# Altium footprint library Indruino.PcbLib: 383 footprints (part 21 of 24)
Each footprint in its own frame and in the unit in brackets; x right, y up, seen from the top. Pads: shape width x height; smd on the part's side, far side on the other; paste and mask are expansions set on the pad; w line width, h text height; cw(c..) or ccw(c..) is an arc to the next point about the centre after c.
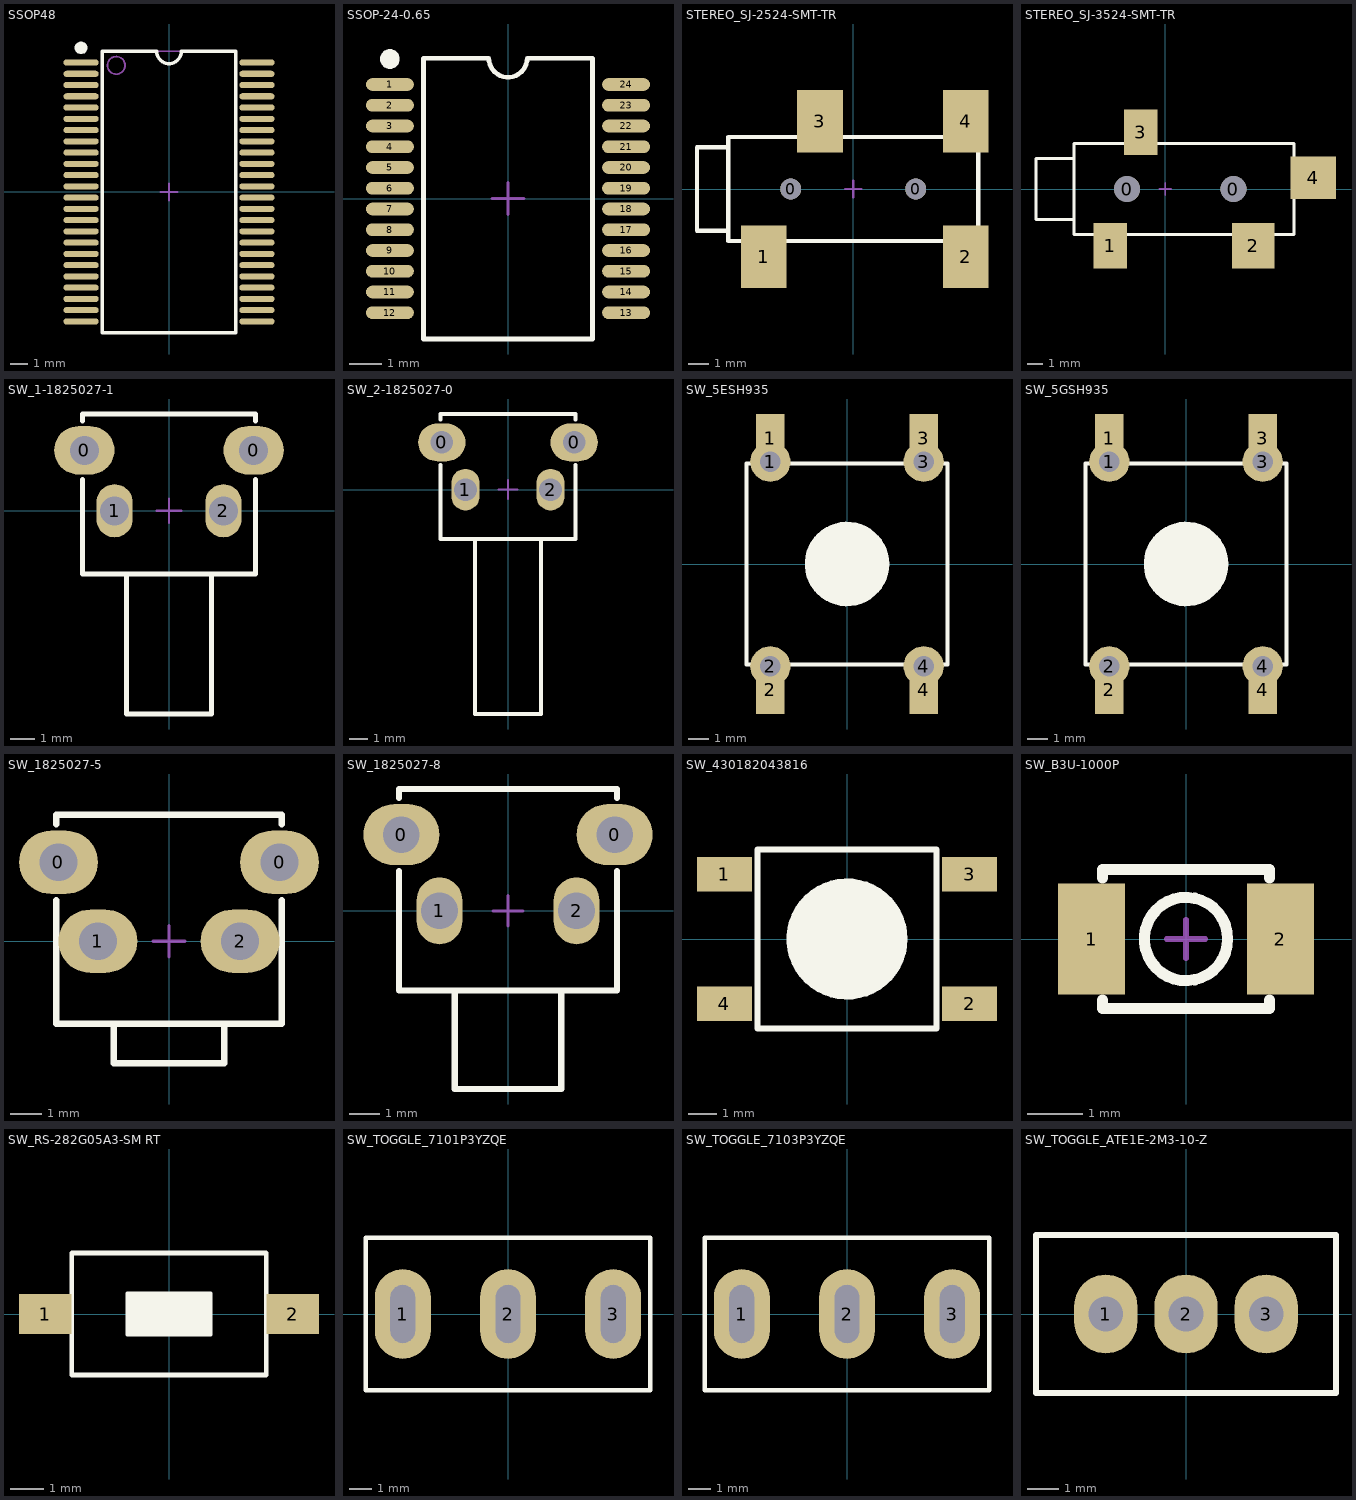
[diagram p20: the footprints below, top view; thin cyan lines are the x and y axes]

## SSOP48 [mm]
pads (48):
  oval 2x0.35 smd: 1(-5,7.36) 2(-5,6.72) 3(-5,6.08) 4(-5,5.44) 5(-5,4.8) 6(-5,4.16) 7(-5,3.52) 8(-5,2.88) 9(-5,2.24) 10(-5,1.6) 11(-5,0.96) 12(-5,0.32) 13(-5,-0.32) 14(-5,-0.96) 15(-5,-1.6) 16(-5,-2.24) 17(-5,-2.88) 18(-5,-3.52) 19(-5,-4.16) 20(-5,-4.8) 21(-5,-5.44) 22(-5,-6.08) 23(-5,-6.72) 24(-5,-7.36) 25(5,-7.36) 26(5,-6.72) 27(5,-6.08) 28(5,-5.44) 29(5,-4.8) 30(5,-4.16) 31(5,-3.52) 32(5,-2.88) 33(5,-2.24) 34(5,-1.6) 35(5,-0.96) 36(5,-0.32) 37(5,0.32) 38(5,0.96) 39(5,1.6) 40(5,2.24) 41(5,2.88) 42(5,3.52) 43(5,4.16) 44(5,4.8) 45(5,5.44) 46(5,6.08) 47(5,6.72) 48(5,7.36)
Top Overlay:
  region: -5,7.85 -5.07,7.85 -5.198,7.903 -5.297,8.002 -5.35,8.13 -5.35,8.2 -5.35,8.27 -5.297,8.398 -5.198,8.497 -5.07,8.55 -5,8.55 -4.93,8.55 -4.802,8.497 -4.703,8.398 -4.65,8.27 -4.65,8.2 -4.65,8.13 -4.703,8.002 -4.802,7.903 -4.93,7.85
  lines w0.2: -3.8,-8 -3.8,8 -0.7,8 ccw(c0,8) 0.7,8 3.8,8 3.8,-8 -3.8,-8
Mechanical 13:
  circle w0.1: c-3,7.2 r0.5
  lines w0.1: -3.8,-8 -3.8,8 3.8,8 3.8,-8 -3.8,-8
Mechanical 15:
  lines w0.1: -0.5,0 0.5,0 ; 0,-0.5 0,0.5
3D body "User Library-SSOP48.step": height 2.57, standoff -0.08, extent -5.2,-8 5.2,8

## SSOP-24-0.65 [mm] "TSSOP, 24-Leads, Body 8.3x5.3mm, Pitch 0.65mm, IPC Low Density"
height 1.5
pads (24):
  oval 1.5x0.4 smd: 1(-3.7,3.575) 2(-3.7,2.925) 3(-3.7,2.275) 4(-3.7,1.625) 5(-3.7,0.975) 6(-3.7,0.325) 7(-3.7,-0.325) 8(-3.7,-0.975) 9(-3.7,-1.625) 10(-3.7,-2.275) 11(-3.7,-2.925) 12(-3.7,-3.575) 13(3.7,-3.575) 14(3.7,-2.925) 15(3.7,-2.275) 16(3.7,-1.625) 17(3.7,-0.975) 18(3.7,-0.325) 19(3.7,0.325) 20(3.7,0.975) 21(3.7,1.625) 22(3.7,2.275) 23(3.7,2.925) 24(3.7,3.575)
Top Overlay:
  region: -3.7,4.075 -3.76,4.075 -3.87,4.121 -3.954,4.205 -4,4.315 -4,4.375 -4,4.435 -3.954,4.545 -3.87,4.629 -3.76,4.675 -3.7,4.675 -3.64,4.675 -3.53,4.629 -3.446,4.545 -3.4,4.435 -3.4,4.375 -3.4,4.315 -3.446,4.205 -3.53,4.121 -3.64,4.075
  lines w0.15: -2.65,-4.4 -2.65,4.4 -0.6,4.4 ccw(c0,4.4) 0.6,4.4 2.65,4.4 2.65,-4.4 -2.65,-4.4
Mechanical 15:
  lines w0.1: -0.5,0 0.5,0 ; 0,-0.5 0,0.5
3D body "User Library-SSOP 24 PIN_.step": height 1.98, standoff -0.01, extent -3.95,-4.315 3.95,4.315

## STEREO_SJ-2524-SMT-TR [mm]
pads (6):
  round 1 hole 1: 0(-3,0) 0(3,0)
  rect 2.2x3 smd: 1(-4.3,-3.25) 2(5.4,-3.25) 3(-1.6,3.25) 4(5.4,3.25)
Top Overlay:
  lines w0.2: -6,-2 -7.5,-2 -7.5,2 -6,2 ; -6,-2.5 6,-2.5 6,2.5 -6,2.5 -6,-2.5
Mechanical 13:
  lines w0.1: -6,-2 -7.5,-2 -7.5,2 -6,2 ; -6,-2.5 -6,2.5 6,2.5 6,-2.5 -6,-2.5
Mechanical 15:
  lines w0.1: -0.4,0 0.4,0 ; 0,-0.4 0,0.4
3D body "sj-2524-smt.stp": height 4.6, standoff -0.7, extent -7.5,-4 6,4

## STEREO_SJ-3524-SMT-TR [mm]
pads (6):
  round 1.7 hole 1.7: 0(-2.5,0) 0(4.5,0)
  rect 2.2x3 smd: 1(-3.6,-3.75) 3(-1.6,3.75)
  rect 2.8x3 smd: 2(5.8,-3.75)
  rect 3x2.8 smd: 4(9.75,0.75)
Top Overlay:
  lines w0.2: -6,-2 -8.5,-2 -8.5,2 -6,2 ; -6,-3 -6,3 8.5,3 8.5,-3 -6,-3
Mechanical 13:
  lines w0.1: -6,-2 -8.5,-2 -8.5,2 -6,2 ; -6,-3 8.5,-3 8.5,3 -6,3 -6,-3
Mechanical 15:
  lines w0.1: -0.4,0 0.4,0 ; 0,-0.4 0,0.4
3D body "sj-3524-smt.stp": height 5.1, standoff -0.7, extent -8.5,-4.5 10.5,4.5

## SW_1-1825027-1 [mm]
pads (4):
  oval 2.5x2 hole 1.2: 0(-3.5,2.5) 0(3.5,2.5)
  oval 1.5x2.2 hole 1.2: 1(-2.25,0) 2(2.25,0)
Top Overlay:
  lines w0.2: -3.575,1.3 -3.575,-2.61 3.575,-2.61 3.575,1.3 ; -3.575,3.7 -3.575,4 3.575,4 3.575,3.7 ; -1.75,-2.61 -1.75,-8.4 1.75,-8.4 1.75,-2.61
Mechanical 15:
  lines w0.1: -0.5,0 0.5,0 ; 0,-0.5 0,0.5
3D body "c-1-1825027-1-g-3d.stp": height 7, standoff -3.52, extent -4.204,-8.34 4.204,4.017

## SW_2-1825027-0 [mm]
pads (4):
  oval 2.5x2 hole 1.2: 0(-3.5,2.5) 0(3.5,2.5)
  oval 1.5x2.2 hole 1.2: 1(-2.25,0) 2(2.25,0)
Top Overlay:
  lines w0.2: -3.575,1.3 -3.575,-2.61 3.575,-2.61 3.575,1.3 ; -3.575,3.7 -3.575,4 3.575,4 3.575,3.7 ; -1.75,-2.61 -1.75,-11.871 1.75,-11.871 1.75,-2.61
Mechanical 15:
  lines w0.1: -0.5,0 0.5,0 ; 0,-0.5 0,0.5
3D body "c-2-1825027-0-g-3d.stp": height 7, standoff -3.52, extent -4.204,-11.871 4.204,3.992

## SW_5ESH935 [mm]
pads (8):
  rect 1.4x2.4 smd: 1(-3.81,6.25) 2(-3.81,-6.25) 3(3.81,6.25) 4(3.81,-6.25)
  round 2 hole 1: 1(-3.81,5.08) 2(-3.81,-5.08) 3(3.81,5.08) 4(3.81,-5.08)
Top Overlay:
  circle w0.2: c0,0 r2
  region: 2,0 2,-0.197 1.923,-0.583 1.772,-0.947 1.554,-1.275 1.275,-1.554 0.947,-1.772 0.583,-1.923 0.197,-2 0,-2 -0.197,-2 -0.583,-1.923 -0.947,-1.772 -1.275,-1.554 -1.554,-1.275 -1.772,-0.947 -1.923,-0.583 -2,-0.197 -2,0 -2,0.197 -1.923,0.583 -1.772,0.947 -1.554,1.275 -1.275,1.554 -0.947,1.772 -0.583,1.923 -0.197,2 0,2 0.197,2 0.583,1.923 0.947,1.772 1.275,1.554 1.554,1.275 1.772,0.947 1.923,0.583 2,0.197
  lines w0.2: -5,-5 5,-5 5,5 -5,5 -5,-5
3D body "5ESH9.stp": height 6.37, standoff 0, extent -5,-7 5,7

## SW_5GSH935 [mm]
pads (8):
  rect 1.4x2.4 smd: 1(-3.81,6.25) 2(-3.81,-6.25) 3(3.81,6.25) 4(3.81,-6.25)
  round 2 hole 1: 1(-3.81,5.08) 2(-3.81,-5.08) 3(3.81,5.08) 4(3.81,-5.08)
Top Overlay:
  circle w0.2: c0,0 r2
  region: 2,0 2,-0.197 1.923,-0.583 1.772,-0.947 1.554,-1.275 1.275,-1.554 0.947,-1.772 0.583,-1.923 0.197,-2 0,-2 -0.197,-2 -0.583,-1.923 -0.947,-1.772 -1.275,-1.554 -1.554,-1.275 -1.772,-0.947 -1.923,-0.583 -2,-0.197 -2,0 -2,0.197 -1.923,0.583 -1.772,0.947 -1.554,1.275 -1.275,1.554 -0.947,1.772 -0.583,1.923 -0.197,2 0,2 0.197,2 0.583,1.923 0.947,1.772 1.275,1.554 1.554,1.275 1.772,0.947 1.923,0.583 2,0.197
  lines w0.2: -5,-5 5,-5 5,5 -5,5 -5,-5
3D body "5ESH9.stp": height 6.37, standoff 0, extent -5,-7 5,7

## SW_1825027-5 [mm]
pads (4):
  oval 2.5x2 hole 1.2: 0(-3.5,2.5) 0(3.5,2.5) 1(-2.25,0) 2(2.25,0)
Top Overlay:
  lines w0.2: -3.575,1.3 -3.575,-2.61 3.575,-2.61 3.575,1.3 ; -3.575,3.7 -3.575,4 3.575,4 3.575,3.7 ; -1.75,-2.61 -1.75,-3.86 1.75,-3.86 1.75,-2.61
Mechanical 15:
  lines w0.1: -0.5,0 0.5,0 ; 0,-0.5 0,0.5
3D body "TS6-THT-RA_H-5.0.step": height 7, standoff -3.5, extent -4.197,-3.8 4.197,3.95

## SW_1825027-8 [mm]
pads (4):
  oval 2.5x2 hole 1.2: 0(-3.5,2.5) 0(3.5,2.5)
  oval 1.5x2.2 hole 1.2: 1(-2.25,0) 2(2.25,0)
Top Overlay:
  lines w0.2: -3.575,1.3 -3.575,-2.61 3.575,-2.61 3.575,1.3 ; -3.575,3.7 -3.575,4 3.575,4 3.575,3.7 ; -1.75,-2.61 -1.75,-5.851 1.75,-5.851 1.75,-2.61
Mechanical 15:
  lines w0.1: -0.5,0 0.5,0 ; 0,-0.5 0,0.5
3D body "c-1825027-8-g-3d.stp": height 7, standoff -3.52, extent -4.204,-5.851 4.204,3.991

## SW_430182043816 [mm]
pads (4):
  rect 1.9x1.2 smd: 1(-4.25,2.25) 2(4.25,-2.25) 3(4.25,2.25) 4(-4.25,-2.25)
Top Overlay:
  circle w0.2: c0,0 r2
  region: 0,-2 -0.197,-2 -0.583,-1.923 -0.947,-1.772 -1.275,-1.554 -1.554,-1.275 -1.772,-0.947 -1.923,-0.583 -2,-0.197 -2,0 -2,0.197 -1.923,0.583 -1.772,0.947 -1.554,1.275 -1.275,1.554 -0.947,1.772 -0.583,1.923 -0.197,2 0,2 0.197,2 0.583,1.923 0.947,1.772 1.275,1.554 1.554,1.275 1.772,0.947 1.923,0.583 2,0.197 2,0 2,-0.197 1.923,-0.583 1.772,-0.947 1.554,-1.275 1.275,-1.554 0.947,-1.772 0.583,-1.923 0.197,-2
  lines w0.2: -3.1,-3.1 -3.1,3.1 3.1,3.1 3.1,-3.1 -3.1,-3.1
3D body "STEP-430182043816-rev1.stp": height 4.3, standoff 0, extent -4.5,-3.1 4.5,3.1

## SW_B3U-1000P [mm]
pads (2):
  rect 1.2x2 smd: 1(-1.7,0) 2(1.7,0)
Top Overlay:
  circle w0.2: c0,0 r0.75
  lines w0.2: -1.5,-1.1 -1.5,-1.25 1.5,-1.25 1.5,-1.1 ; -1.5,1.1 -1.5,1.25 1.5,1.25 1.5,1.1
Mechanical 15:
  lines w0.1: -0.35,0 0.35,0 ; 0,-0.35 0,0.35
3D body "b3u-1000p.stp": height 1.6, standoff 0, extent -2,-1.25 2,1.25

## SW_RS-282G05A3-SM RT [mm]
pads (2):
  rect 1.6x1.2 smd: 1(-3.75,0) 2(3.75,0)
Top Overlay:
  rectangle: -1.27,-0.635 1.27,0.635
  lines w0.1: -1.27,-0.635 1.27,-0.635 1.27,0.635 -1.27,0.635 -1.27,-0.635
  lines w0.15: -2.95,-1.854 -2.95,1.854 2.95,1.854 2.95,-1.854 -2.95,-1.854
Mechanical 13:
  lines w0.1: -2.95,-1.85 2.95,-1.85 2.95,1.85 -2.95,1.85 -2.95,-1.85
Mechanical 15:
  lines w0.1: -0.5,0 0.5,0 ; 0,-0.5 0,0.5
3D body "Tactile Switch_RS-282G05A3-SM RT.stp": height 2.5, standoff -0.02, extent -4,-1.8 4,1.8

## SW_TOGGLE_7101P3YZQE [mm]
pads (3):
  oval 2.5x4 hole 2.6 slot 1.1 at 0 deg: 1(-4.7,0) 2(0,0) 3(4.7,0)
Top Overlay:
  lines w0.2: -6.35,-3.4 6.35,-3.4 6.35,3.4 -6.35,3.4 -6.35,-3.4
3D body "710xp3yz_101411.stp": height 30.93, standoff -2.12, extent -6.35,-3.378 6.35,3.378

## SW_TOGGLE_7103P3YZQE [mm]
pads (3):
  oval 2.5x4 hole 2.6 slot 1.1 at 0 deg: 1(-4.7,0) 2(0,0) 3(4.7,0)
Top Overlay:
  lines w0.2: -6.35,-3.4 6.35,-3.4 6.35,3.4 -6.35,3.4 -6.35,-3.4
3D body "710xp3yz_101411.stp": height 30.93, standoff -2.12, extent -6.35,-3.378 6.35,3.378

## SW_TOGGLE_ATE1E-2M3-10-Z [mm]
pads (3):
  oval 2x2.5 hole 1.1: 1(-2.54,0) 2(0,0) 3(2.54,0)
Top Overlay:
  lines w0.2: -4.75,-2.5 -4.75,2.5 4.75,2.5 4.75,-2.5 -4.75,-2.5
3D body "ATE1E-2M3-10-Z.stp": height 16.66, standoff -3.3, extent -4.75,-2.5 4.75,2.5